# Altium footprint library Connectors THD.PcbLib: 631 footprints (part 18 of 46) (continued)
## HARTING_09 12 000 9908 [mm] "7 Positions, PC Board Adaptor For Han Q7/0® Module (PCB Thickness up to 2.4 mm)"
height 23
pads (7):
  round 1.6 hole 0.9: 1M7F(-6.3,4.8) 2M6F(-6.3,0) 3M5F(-6.3,-4.8) 4M4F(0,-4.8) 5M3F(6.3,-4.8) 6M2F(6.3,0) 7M1F(6.3,4.8)
Top Overlay:
  circle w0.2: c-6.3,0 r2.1
  circle w0.2: c0,-4.8 r2.1
  circle w0.2: c0,-4.8 r1.6
  circle w0.2: c-6.3,-4.8 r1.6
  circle w0.2: c-6.3,0 r1.6
  circle w0.2: c-6.3,4.8 r1.6
  circle w0.2: c6.3,4.8 r1.6
  circle w0.2: c6.3,0 r1.6
  circle w0.2: c6.3,-4.8 r1.6
  circle w0.2: c6.3,0 r2.1
  circle w0.2: c6.3,4.8 r2.1
  circle w0.2: c6.3,-4.8 r2.1
  circle w0.2: c-6.3,-4.8 r2.1
  circle w0.2: c-6.3,4.8 r2.1
  lines w0.2: -8.4,-4.8 -8.4,4.8 ; -6.3,-6.9 6.3,-6.9 ; -4.2,4.8 ccw(c-1.7,4.8) -1.699,2.3 1.7,2.301 ; 1.7,2.301 ccw(c1.7,4.801) 4.2,4.8 ; 8.4,-4.8 8.4,4.799
  text "1M" at -3.6,4.4 h1.2
  text "1F" at 1.8,4.3 h1.2
Mechanical 8:
  lines w0.1: -6.8,-4.8 -6.3,-4.8 ; -6.8,0 -6.3,0 ; -6.8,4.8 -6.3,4.8 ; -6.3,-5.3 -6.3,-4.8 ; -6.3,-4.3 -6.3,-4.8 ; -6.3,-0.5 -6.3,0 ; -6.3,0.5 -6.3,0 ; -6.3,4.3 -6.3,4.8 ; -6.3,5.3 -6.3,4.8 ; -5.8,-4.8 -6.3,-4.8 ; -5.8,0 -6.3,0 ; -5.8,4.8 -6.3,4.8 ; -0.5,-4.8 0,-4.8 ; -0.5,0 0,0 ; 0,-5.3 0,-4.8 ; 0,-4.3 0,-4.8 ; 0,-0.5 0,0 ; 0,0.5 0,0 ; 0.5,-4.8 0,-4.8 ; 0.5,0 0,0 ; 5.8,-4.8 6.3,-4.8 ; 5.8,0 6.3,0 ; 5.8,4.8 6.3,4.8 ; 6.3,-5.3 6.3,-4.8 ; 6.3,-4.3 6.3,-4.8 ; 6.3,-0.5 6.3,0 ; 6.3,0.5 6.3,0 ; 6.3,4.3 6.3,4.8 ; 6.3,5.3 6.3,4.8 ; 6.8,-4.8 6.3,-4.8 ; 6.8,0 6.3,0 ; 6.8,4.8 6.3,4.8
Mechanical 14:
  circle w0.1: c-6.3,0 r2.1
  circle w0.1: c0,-4.8 r2.1
  circle w0.1: c0,-4.8 r1.6
  circle w0.1: c0,-4.8 r0.6
  circle w0.1: c-6.3,-4.8 r1.6
  circle w0.1: c-6.3,-4.8 r0.6
  circle w0.1: c-6.3,0 r1.6
  circle w0.1: c-6.3,0 r0.6
  circle w0.1: c-6.3,4.8 r1.6
  circle w0.1: c-6.3,4.8 r0.6
  circle w0.1: c6.3,4.8 r1.6
  circle w0.1: c6.3,4.8 r0.6
  circle w0.1: c6.3,0 r1.6
  circle w0.1: c6.3,0 r0.6
  circle w0.1: c6.3,-4.8 r1.6
  circle w0.1: c6.3,-4.8 r0.6
  circle w0.1: c6.3,0 r2.1
  circle w0.1: c6.3,4.8 r2.1
  circle w0.1: c6.3,-4.8 r2.1
  circle w0.1: c-6.3,-4.8 r2.1
  circle w0.1: c-6.3,4.8 r2.1
  lines w0.1: -8.4,-4.8 -8.4,4.8 ; -6.3,-6.9 6.3,-6.9 ; -4.2,4.8 ccw(c-1.7,4.8) -1.699,2.3 1.7,2.301 ; 1.7,2.301 ccw(c1.7,4.801) 4.2,4.8 ; 8.4,-4.8 8.4,4.799
  text "1M" at -3.6,4.4 h1.2
  text "1F" at 1.8,4.3 h1.2
3D body: height 15.9, standoff -3.4, extent -8.4,-6.9 8.4,6.9

## HARTING_09 12 012 9901 [mm] "12 Positions + PE, PC Board Adaptor For Han Q12/0® Module (PCB Thickness up to 2.4 mm)"
height 14.65
pads (13):
  round 1.6 hole 0.9: 1M4F(-6.75,-6.75) 2M3F(-2.25,-6.75) 3M2F(2.25,-6.75) 4M1F(6.75,-6.75) 5M8F(-6.75,-2.25) 6M7F(-2.25,-2.25) 7M6F(2.25,-2.25) 8M5F(6.75,-2.25) 9M10F(-6.75,2.25) 10M9F(6.75,2.25) 11M12F(-6.75,6.75) 12M11F(6.75,6.75) PE(0,5.85)
Top Overlay:
  circle w0.2: c0,5.85 r2.1
  circle w0.2: c0,5.85 r1.6
  circle w0.2: c6.75,2.25 r1.85
  circle w0.2: c6.75,2.25 r1.6
  circle w0.2: c6.75,6.75 r1.85
  circle w0.2: c6.75,6.75 r1.6
  circle w0.2: c-6.75,6.75 r1.85
  circle w0.2: c-6.75,6.75 r1.6
  circle w0.2: c-6.75,2.25 r1.85
  circle w0.2: c-6.75,2.25 r1.6
  circle w0.2: c6.75,-2.25 r1.85
  circle w0.2: c6.75,-2.25 r1.6
  circle w0.2: c2.25,-2.25 r1.85
  circle w0.2: c2.25,-2.25 r1.6
  circle w0.2: c-2.25,-2.25 r1.85
  circle w0.2: c-2.25,-2.25 r1.6
  circle w0.2: c-6.75,-2.25 r1.85
  circle w0.2: c-6.75,-2.25 r1.6
  circle w0.2: c-6.75,-6.75 r1.85
  circle w0.2: c-6.75,-6.75 r1.6
  circle w0.2: c-2.25,-6.75 r1.85
  circle w0.2: c-2.25,-6.75 r1.6
  circle w0.2: c2.25,-6.75 r1.85
  circle w0.2: c2.25,-6.75 r1.6
  circle w0.2: c6.75,-6.75 r1.85
  circle w0.2: c6.75,-6.75 r1.6
  lines w0.2: -3.9,3.55 3.9,3.55 ; -3.9,8.55 3.9,8.55 ; -9.1,-7.1 ccw(c-7.1,-7.1) -7.1,-9.1 7.1,-9.1 ccw(c7.1,-7.1) 9.1,-7.1 9.1,7.1 ccw(c7.1,7.1) 7.1,9.1 4.4,9.1 ccw(c4.4,8.6) 3.9,8.6 3.9,0.15 cw(c3.4,0.15) 3.4,-0.35 -3.4,-0.35 cw(c-3.4,0.15) -3.9,0.15 -3.9,8.6 ccw(c-4.4,8.6) -4.4,9.1 -7.1,9.1 ccw(c-7.1,7.1) -9.1,7.1 -9.1,-7.1
  text "1F" at 5.9,-10.8 h1.2
  text "1M" at -7.6,-10.8 h1.2
Mechanical 8:
  lines w0.1: -7.25,-6.75 -6.75,-6.75 ; -7.25,-2.25 -6.75,-2.25 ; -7.25,2.25 -6.75,2.25 ; -7.25,6.75 -6.75,6.75 ; -6.75,-7.25 -6.75,-6.75 ; -6.75,-6.25 -6.75,-6.75 ; -6.75,-2.75 -6.75,-2.25 ; -6.75,-1.75 -6.75,-2.25 ; -6.75,1.75 -6.75,2.25 ; -6.75,2.75 -6.75,2.25 ; -6.75,6.25 -6.75,6.75 ; -6.75,7.25 -6.75,6.75 ; -6.25,-6.75 -6.75,-6.75 ; -6.25,-2.25 -6.75,-2.25 ; -6.25,2.25 -6.75,2.25 ; -6.25,6.75 -6.75,6.75 ; -2.75,-6.75 -2.25,-6.75 ; -2.75,-2.25 -2.25,-2.25 ; -2.25,-7.25 -2.25,-6.75 ; -2.25,-6.25 -2.25,-6.75 ; -2.25,-2.75 -2.25,-2.25 ; -2.25,-1.75 -2.25,-2.25 ; -1.75,-6.75 -2.25,-6.75 ; -1.75,-2.25 -2.25,-2.25 ; -0.5,0 0,0 ; -0.5,5.85 0,5.85 ; 0,-0.5 0,0 ; 0,0.5 0,0 ; 0,5.35 0,5.85 ; 0,6.35 0,5.85 ; 0.5,0 0,0 ; 0.5,5.85 0,5.85 ; 1.75,-6.75 2.25,-6.75 ; 1.75,-2.25 2.25,-2.25 ; 2.25,-7.25 2.25,-6.75 ; 2.25,-6.25 2.25,-6.75 ; 2.25,-2.75 2.25,-2.25 ; 2.25,-1.75 2.25,-2.25 ; 2.75,-6.75 2.25,-6.75 ; 2.75,-2.25 2.25,-2.25 ; 6.25,-6.75 6.75,-6.75 ; 6.25,-2.25 6.75,-2.25 ; 6.25,2.25 6.75,2.25 ; 6.25,6.75 6.75,6.75 ; 6.75,-7.25 6.75,-6.75 ; 6.75,-6.25 6.75,-6.75 ; 6.75,-2.75 6.75,-2.25 ; 6.75,-1.75 6.75,-2.25 ; 6.75,1.75 6.75,2.25 ; 6.75,2.75 6.75,2.25 ; 6.75,6.25 6.75,6.75 ; 6.75,7.25 6.75,6.75 ; 7.25,-6.75 6.75,-6.75 ; 7.25,-2.25 6.75,-2.25 ; 7.25,2.25 6.75,2.25 ; 7.25,6.75 6.75,6.75
Mechanical 14:
  circle w0.1: c0,5.85 r2.1
  circle w0.1: c0,5.85 r1.6
  circle w0.1: c0,5.85 r0.6
  circle w0.1: c6.75,2.25 r1.85
  circle w0.1: c6.75,2.25 r1.6
  circle w0.1: c6.75,2.25 r0.6
  circle w0.1: c6.75,6.75 r1.85
  circle w0.1: c6.75,6.75 r1.6
  circle w0.1: c6.75,6.75 r0.6
  circle w0.1: c-6.75,6.75 r1.85
  circle w0.1: c-6.75,6.75 r1.6
  circle w0.1: c-6.75,6.75 r0.6
  circle w0.1: c-6.75,2.25 r1.85
  circle w0.1: c-6.75,2.25 r1.6
  circle w0.1: c-6.75,2.25 r0.6
  circle w0.1: c6.75,-2.25 r1.85
  circle w0.1: c6.75,-2.25 r1.6
  circle w0.1: c6.75,-2.25 r0.6
  circle w0.1: c2.25,-2.25 r1.85
  circle w0.1: c2.25,-2.25 r1.6
  circle w0.1: c2.25,-2.25 r0.6
  circle w0.1: c-2.25,-2.25 r1.85
  circle w0.1: c-2.25,-2.25 r1.6
  circle w0.1: c-2.25,-2.25 r0.6
  circle w0.1: c-6.75,-2.25 r1.85
  circle w0.1: c-6.75,-2.25 r1.6
  circle w0.1: c-6.75,-2.25 r0.6
  circle w0.1: c-6.75,-6.75 r1.85
  circle w0.1: c-6.75,-6.75 r1.6
  circle w0.1: c-6.75,-6.75 r0.6
  circle w0.1: c-2.25,-6.75 r1.85
  circle w0.1: c-2.25,-6.75 r1.6
  circle w0.1: c-2.25,-6.75 r0.6
  circle w0.1: c2.25,-6.75 r1.85
  circle w0.1: c2.25,-6.75 r1.6
  circle w0.1: c2.25,-6.75 r0.6
  circle w0.1: c6.75,-6.75 r1.85
  circle w0.1: c6.75,-6.75 r1.6
  circle w0.1: c6.75,-6.75 r0.6
  lines w0.1: -3.9,3.55 3.9,3.55 ; -3.9,8.55 3.9,8.55 ; -9.1,-7.1 ccw(c-7.1,-7.1) -7.1,-9.1 7.1,-9.1 ccw(c7.1,-7.1) 9.1,-7.1 9.1,7.1 ccw(c7.1,7.1) 7.1,9.1 4.4,9.1 ccw(c4.4,8.6) 3.9,8.6 3.9,0.15 cw(c3.4,0.15) 3.4,-0.35 -3.4,-0.35 cw(c-3.4,0.15) -3.9,0.15 -3.9,8.6 ccw(c-4.4,8.6) -4.4,9.1 -7.1,9.1 ccw(c-7.1,7.1) -9.1,7.1 -9.1,-7.1
  text "1F" at 5.9,-10.8 h1.2
  text "1M" at -7.6,-10.8 h1.2
3D body: height 14.65, standoff -3.65, extent -9.1,-9.1 9.1,9.1

## HARTING_09 16 000 9908 [mm] "6 Positions, PC Board Adaptor For Han DD® Module (PCB Thickness up to 2.4 mm)"
height 15.9
pads (6):
  round 1.6 hole 0.9: 1(-11.25,0) 2(-6.75,0) 3(-2.25,0) 4(2.25,0) 5(6.75,0) 6(11.25,0)
Top Overlay:
  circle w0.2: c11.25,0 r1.861
  circle w0.2: c11.25,0 r1.65
  circle w0.2: c6.75,0 r1.861
  circle w0.2: c6.75,0 r1.65
  circle w0.2: c2.25,0 r1.861
  circle w0.2: c2.25,0 r1.65
  circle w0.2: c-2.25,0 r1.861
  circle w0.2: c-2.25,0 r1.65
  circle w0.2: c-6.75,0 r1.861
  circle w0.2: c-11.25,0 r1.861
  circle w0.2: c-11.25,0 r1.65
  circle w0.2: c-6.75,0 r1.65
  lines w0.2: -10.379,-1.75 -10.09,-2.25 ; -10.08,2.25 -10.426,2.85 cw(c-10.253,2.95) -10.253,3.15 -7.747,3.15 cw(c-7.747,2.95) -7.574,2.85 -7.92,2.25 ; -9.5,-1.25 -8.5,-1.25 ; -7.91,-2.25 -7.621,-1.75 ; 3.121,-1.75 3.41,-2.25 ; 3.42,2.25 3.074,2.85 cw(c3.247,2.95) 3.247,3.15 5.753,3.15 cw(c5.753,2.95) 5.926,2.85 5.58,2.25 ; 4,-1.25 5,-1.25 ; 5.59,-2.25 5.879,-1.75 ; -14,-1.25 ccw(c-13,-1.25) -13,-2.25 13,-2.25 ccw(c13,-1.25) 14,-1.25 14,1.25 ccw(c13,1.25) 13,2.25 -13,2.25 ccw(c-13,1.25) -14,1.25 -14,-1.25
  text "1" at -14.9,-0.5 h1.2
  text "6" at 14.585,-0.527 h1.2
Mechanical 8:
  lines w0.1: -11.75,0 -11.25,0 ; -11.25,-0.5 -11.25,0 ; -11.25,0.5 -11.25,0 ; -10.75,0 -11.25,0 ; -7.25,0 -6.75,0 ; -6.75,-0.5 -6.75,0 ; -6.75,0.5 -6.75,0 ; -6.25,0 -6.75,0 ; -2.75,0 -2.25,0 ; -2.25,-0.5 -2.25,0 ; -2.25,0.5 -2.25,0 ; -1.75,0 -2.25,0 ; -0.5,0 0,0 ; 0,-0.5 0,0 ; 0,0.5 0,0 ; 0.5,0 0,0 ; 1.75,0 2.25,0 ; 2.25,-0.5 2.25,0 ; 2.25,0.5 2.25,0 ; 2.75,0 2.25,0 ; 6.25,0 6.75,0 ; 6.75,-0.5 6.75,0 ; 6.75,0.5 6.75,0 ; 7.25,0 6.75,0 ; 10.75,0 11.25,0 ; 11.25,-0.5 11.25,0 ; 11.25,0.5 11.25,0 ; 11.75,0 11.25,0
Mechanical 14:
  circle w0.1: c11.25,0 r1.861
  circle w0.1: c11.25,0 r1.65
  circle w0.1: c11.25,0 r0.6
  circle w0.1: c6.75,0 r1.861
  circle w0.1: c6.75,0 r1.65
  circle w0.1: c6.75,0 r0.6
  circle w0.1: c2.25,0 r1.861
  circle w0.1: c2.25,0 r1.65
  circle w0.1: c2.25,0 r0.6
  circle w0.1: c-2.25,0 r1.861
  circle w0.1: c-2.25,0 r1.65
  circle w0.1: c-2.25,0 r0.6
  circle w0.1: c-6.75,0 r1.861
  circle w0.1: c-6.75,0 r1.65
  circle w0.1: c-6.75,0 r0.6
  circle w0.1: c-11.25,0 r1.861
  circle w0.1: c-11.25,0 r1.65
  circle w0.1: c-11.25,0 r0.6
  lines w0.1: -10.494,-1.55 cw(c-10.321,-1.45) -10.321,-1.25 -10,-1.25 ; -10.379,-1.75 -10.09,-2.25 ; -10.08,2.25 -10.426,2.85 cw(c-10.253,2.95) -10.253,3.15 -7.747,3.15 cw(c-7.747,2.95) -7.574,2.85 -7.92,2.25 ; -9.5,-1.25 -8.5,-1.25 ; -8,-1.25 -7.679,-1.25 cw(c-7.679,-1.45) -7.506,-1.55 ; -7.91,-2.25 -7.621,-1.75 ; 3.006,-1.55 cw(c3.179,-1.45) 3.179,-1.25 3.5,-1.25 ; 3.121,-1.75 3.41,-2.25 ; 3.42,2.25 3.074,2.85 cw(c3.247,2.95) 3.247,3.15 5.753,3.15 cw(c5.753,2.95) 5.926,2.85 5.58,2.25 ; 4,-1.25 5,-1.25 ; 5.5,-1.25 5.821,-1.25 cw(c5.821,-1.45) 5.994,-1.55 ; 5.59,-2.25 5.879,-1.75 ; -14,-1.25 ccw(c-13,-1.25) -13,-2.25 13,-2.25 ccw(c13,-1.25) 14,-1.25 14,1.25 ccw(c13,1.25) 13,2.25 -13,2.25 ccw(c-13,1.25) -14,1.25 -14,-1.25
  text "6" at 14.585,-0.527 h1.2
  text "1" at -14.9,-0.5 h1.2
3D body: height 15.9, standoff -3.3, extent -14,-2.25 14,3.15

## HARTING_09 22 132 6921 [mm] "Connector; DIN 41612, Type 2B, Thru-Hole; Rows a+b, 32 Position; Right Angle"
height 8.5
pads (34):
  round 1.7 hole 1: a1(0,0) a2(0,-2.54) a3(0,-5.08) a4(0,-7.62) a5(0,-10.16) a6(0,-12.7) a7(0,-15.24) a8(0,-17.78) a9(0,-20.32) a10(0,-22.86) a11(0,-25.4) a12(0,-27.94) a13(0,-30.48) a14(0,-33.02) a15(0,-35.56) a16(0,-38.1) b1(-2.54,0) b2(-2.54,-2.54) b3(-2.54,-5.08) b4(-2.54,-7.62) b5(-2.54,-10.16) b6(-2.54,-12.7) b7(-2.54,-15.24) b8(-2.54,-17.78) b9(-2.54,-20.32) b10(-2.54,-22.86) b11(-2.54,-25.4) b12(-2.54,-27.94) b13(-2.54,-30.48) b14(-2.54,-33.02) b15(-2.54,-35.56) b16(-2.54,-38.1)
  round 3.5 / inner round 3.5 / far side round 5.1 hole 2.8: MTG1(2.54,5.08) MTG2(2.54,-43.18)
Top Overlay:
  lines w0.2: 2.04,-40.18 -0.36,-40.18 -0.36,-46.05 7.69,-46.05 7.69,-42.5 ; 2.04,2.08 -0.36,2.08 -0.36,7.95 7.69,7.95 7.69,4.4 ; 4.32,-41.15 3.847,-40.33 2.04,-40.33 2.04,2.23 3.847,2.23 4.32,3.05 ; 5.3,-42.5 12.64,-42.5 12.64,4.4 5.3,4.4
  text "15" at -5.855,-36.235 h1.2
  text "1" at -4.58,-0.7 h1.2
  text "b" at -2.56,1.87 h1.2
  text "a" at -1.12,1.87 h1.2
  text "5" at -4.93,-10.735 h1.2
  text "10" at -5.855,-23.535 h1.2
Mechanical 8:
  drawing of 209 lines, arcs and shapes, not listed
  text "PCB" at 5.055,-19.45 h1.2
Mechanical 14:
  circle w0.1: c2.54,-43.18 r1.25
  circle w0.1: c2.54,5.08 r1.25
  lines w0.1: 2.04,-40.18 -0.36,-40.18 -0.36,-46.05 7.69,-46.05 7.69,-42.5 ; 2.04,2.08 -0.36,2.08 -0.36,7.95 7.69,7.95 7.69,4.4 ; 2.04,-40.33 2.04,2.23 3.847,2.23 5.1,4.4 12.64,4.4 12.64,-42.5 5.1,-42.5 3.847,-40.33 2.04,-40.33
  text "15" at -5.855,-36.235 h1.2
  text "10" at -5.855,-23.535 h1.2
  text "1" at -4.58,-0.7 h1.2
  text "5" at -4.93,-10.735 h1.2
3D body: height 6.83, standoff -3, extent -2.79,-46.05 12.64,7.95

## HARTING_09 22 232 6850 [mm] "DIN 41612, Type 2B, Thru-Hole Press-in Terminations;  Rows a+b, 32 Positions, Performance level 2, Lead 4.5 mm, Pitch 2.54mm, Straight Female Connector"
height 11.6
pads (34):
  round 1.7 hole 1: a1(0,0) a2(0,-2.54) a3(0,-5.08) a4(0,-7.62) a5(0,-10.16) a6(0,-12.7) a7(0,-15.24) a8(0,-17.78) a9(0,-20.32) a10(0,-22.86) a11(0,-25.4) a12(0,-27.94) a13(0,-30.48) a14(0,-33.02) a15(0,-35.56) a16(0,-38.1) b1(2.54,0) b2(2.54,-2.54) b3(2.54,-5.08) b4(2.54,-7.62) b5(2.54,-10.16) b6(2.54,-12.7) b7(2.54,-15.24) b8(2.54,-17.78) b9(2.54,-20.32) b10(2.54,-22.86) b11(2.54,-25.4) b12(2.54,-27.94) b13(2.54,-30.48) b14(2.54,-33.02) b15(2.54,-35.56) b16(2.54,-38.1)
  round 3.5 / inner round 3.5 / far side round 5.1 hole 2.8: MTG1(2.24,5.95) MTG2(2.24,-44.05)
Top Overlay:
  lines w0.2: -2.73,-44.05 -0.71,-44.05 ; -2.73,5.95 -0.71,5.95 ; -1.08,-37.705 -1.08,-40.6 ; -1.08,0.395 -1.08,2.5 ; -0.71,-46.5 -0.71,-44.05 ; -0.71,8.4 -0.71,5.95 ; -0.214,-43.191 -0.71,-44.05 ; -0.214,5.091 -0.71,5.95 ; 0.269,-42.354 0.907,-41.25 3.653,-41.25 4.375,-42.5 5.27,-42.5 ; 0.269,4.254 0.907,3.15 3.025,3.15 ; 1.37,-46.5 -2.73,-46.5 -2.73,8.4 1.37,8.4 ; 3.11,-46.5 5.27,-46.5 5.27,8.4 3.11,8.4 ; 3.62,-38.495 3.62,-39.55 ; 3.62,0.395 3.62,1.45 ; 4.014,3.775 4.375,4.4 5.27,4.4 ; -1.73,-41.25 -1.08,-40.6 ; -1.73,-41.25 -1.73,3.15 ; -1.73,-41.25 1.17,-41.25 ; -1.73,3.15 -1.08,2.5 ; -1.73,3.15 1.17,3.15 ; -1.08,-40.6 0.52,-40.6 ; -1.08,2.5 0.52,2.5 ; 0.52,-40.6 1.17,-41.25 ; 0.52,-40.6 0.52,-39.55 ; 0.52,-39.55 1.17,-40.2 ; 0.52,-39.55 3.62,-39.55 ; 0.52,1.45 1.17,2.1 ; 0.52,1.45 3.62,1.45 ; 0.52,1.45 0.52,2.5 ; 0.52,2.5 1.17,3.15 ; 1.17,-41.25 1.17,-40.2 ; 1.17,-40.2 4.27,-40.2 ; 1.17,2.1 4.27,2.1 ; 1.17,2.1 1.17,3.15 ; 3.62,-39.55 4.27,-40.2 ; 3.62,1.45 4.27,2.1 ; 4.27,-40.2 4.27,2.1
  text "a" at -0.575,3.725 h1.2
  text "b" at 4.65,2.55 h1.2
  text "10" at -5.34,-23.51 h1.2
  text "5" at -4.415,-10.71 h1.2
  text "1" at -4.065,-0.675 h1.2
  text "15" at -5.34,-36.21 h1.2
Mechanical 8:
  lines w0.1: 0,-38.1 -0.5,-38.1 0,-38.1 ; 0,-38.1 0,-38.6 0,-38.1 ; 0,-38.1 0.5,-38.1 0,-38.1 ; 0,-38.1 0,-37.6 0,-38.1 ; 0,0 -0.5,0 0,0 ; 0,0 0,-0.5 0,0 ; 0,0 0.5,0 0,0 ; 0,0 0,0.5 0,0 ; 2.24,-44.05 1.74,-44.05 2.24,-44.05 ; 2.24,-44.05 2.24,-44.55 2.24,-44.05 ; 2.24,-44.05 2.74,-44.05 2.24,-44.05 ; 2.24,-44.05 2.24,-43.55 2.24,-44.05 ; 2.24,5.95 1.74,5.95 2.24,5.95 ; 2.24,5.95 2.24,5.45 2.24,5.95 ; 2.24,5.95 2.74,5.95 2.24,5.95 ; 2.24,5.95 2.24,6.45 2.24,5.95 ; 2.54,-38.1 2.04,-38.1 2.54,-38.1 ; 2.54,-38.1 2.54,-38.6 2.54,-38.1 ; 2.54,-38.1 3.04,-38.1 2.54,-38.1 ; 2.54,-38.1 2.54,-37.6 2.54,-38.1 ; 2.54,0 2.04,0 2.54,0 ; 2.54,0 2.54,-0.5 2.54,0 ; 2.54,0 3.04,0 2.54,0 ; 2.54,0 2.54,0.5 2.54,0
Mechanical 14:
  drawing of 426 lines, arcs and shapes, not listed
  text "b" at 4.65,2.55 h1.2
  text "a" at -0.575,3.725 h1.2
  text "5" at -4.415,-10.71 h1.2
  text "1" at -4.065,-0.675 h1.2
  text "10" at -5.34,-23.51 h1.2
  text "15" at -5.34,-36.21 h1.2
Drill Drawing:
  lines w0.1: -2.73,-39.5 5.27,-39.5 5.27,1.5 -2.73,1.5 -2.73,-39.5
  text "PRESS-FIT TECHNOLOGY diam. 1mm +0.1 -0" at -1.325,-37.125 h1
3D body: height 11.6, standoff -4.5, extent -2.73,-46.5 5.27,8.4

## HARTING_09 23 148 6921 [mm] "DIN 41612, Type 2C, Thru-Hole;  Rows a+b+c, 48 Position, Performance level 2, Lead 3.0 mm, Pitch 2.54mm, Right Angle Male Connector"
height 11
pads (50):
  round 1.7 hole 1: a1(0,0) a2(0,-2.54) a3(0,-5.08) a4(0,-7.62) a5(0,-10.16) a6(0,-12.7) a7(0,-15.24) a8(0,-17.78) a9(0,-20.32) a10(0,-22.86) a11(0,-25.4) a12(0,-27.94) a13(0,-30.48) a14(0,-33.02) a15(0,-35.56) a16(0,-38.1) b1(-2.54,0) b2(-2.54,-2.54) b3(-2.54,-5.08) b4(-2.54,-7.62) b5(-2.54,-10.16) b6(-2.54,-12.7) b7(-2.54,-15.24) b8(-2.54,-17.78) b9(-2.54,-20.32) b10(-2.54,-22.86) b11(-2.54,-25.4) b12(-2.54,-27.94) b13(-2.54,-30.48) b14(-2.54,-33.02) b15(-2.54,-35.56) b16(-2.54,-38.1) c1(-5.08,0) c2(-5.08,-2.54) c3(-5.08,-5.08) c4(-5.08,-7.62) c5(-5.08,-10.16) c6(-5.08,-12.7) c7(-5.08,-15.24) c8(-5.08,-17.78) c9(-5.08,-20.32) c10(-5.08,-22.86) c11(-5.08,-25.4) c12(-5.08,-27.94) c13(-5.08,-30.48) c14(-5.08,-33.02) c15(-5.08,-35.56) c16(-5.08,-38.1)
  round 3.5 / inner round 3.5 / far side round 5.1 hole 2.8: MTG1(2.54,5.08) MTG2(2.54,-43.18)
Top Overlay:
  lines w0.2: 2.04,-40.33 2.04,2.23 ; 7.69,-42.5 7.69,-46.05 -0.36,-46.05 -0.36,-40.33 3.897,-40.33 5.15,-42.5 12.64,-42.5 12.64,4.4 5.15,4.4 3.897,2.23 -0.36,2.23 -0.36,7.95 7.69,7.95 7.69,4.4
Mechanical 8:
  lines w0.1: -5.58,-38.1 -5.08,-38.1 ; -5.58,0 -5.08,0 ; -5.08,-38.6 -5.08,-38.1 ; -5.08,-37.6 -5.08,-38.1 ; -5.08,-0.5 -5.08,0 ; -5.08,0.5 -5.08,0 ; -4.58,-38.1 -5.08,-38.1 ; -4.58,0 -5.08,0 ; -3.04,-38.1 -2.54,-38.1 ; -3.04,0 -2.54,0 ; -2.54,-38.6 -2.54,-38.1 ; -2.54,-37.6 -2.54,-38.1 ; -2.54,-0.5 -2.54,0 ; -2.54,0.5 -2.54,0 ; -2.04,-38.1 -2.54,-38.1 ; -2.04,0 -2.54,0 ; -0.5,-38.1 0,-38.1 ; -0.5,0 0,0 ; 0,-38.6 0,-38.1 ; 0,-37.6 0,-38.1 ; 0,-0.5 0,0 ; 0,0.5 0,0 ; 0.5,-38.1 0,-38.1 ; 0.5,0 0,0 ; 2.04,-43.18 2.54,-43.18 ; 2.04,5.08 2.54,5.08 ; 2.54,-43.68 2.54,-43.18 ; 2.54,-42.68 2.54,-43.18 ; 2.54,4.58 2.54,5.08 ; 2.54,5.58 2.54,5.08 ; 3.04,-43.18 2.54,-43.18 ; 3.04,5.08 2.54,5.08 ; 5.3,-46.05 5.3,-19.05 5.3,7.95
Mechanical 14:
  circle w0.1: c2.54,-43.18 r1.25
  circle w0.1: c2.54,5.08 r1.25
  lines w0.1: 2.04,-40.33 2.04,2.23 ; 7.69,-42.5 7.69,-46.05 -0.36,-46.05 -0.36,-40.33 3.897,-40.33 5.15,-42.5 12.64,-42.5 12.64,4.4 5.15,4.4 3.897,2.23 -0.36,2.23 -0.36,7.95 7.69,7.95 7.69,4.4
3D body: height 9.35, standoff -3, extent -5.33,-46.05 12.64,7.95

## HARTING_09 23 248 6824 [mm] "DIN 41612, Type 2C, Thru-Hole;  Rows a+b+c, 48 Position, Performance level 2, Lead 2.9 mm, Pitch 2.54mm, Vertical Female Connector"
height 11.6
pads (50):
  round 1.7 hole 1: a1(0,0) a2(0,-2.54) a3(0,-5.08) a4(0,-7.62) a5(0,-10.16) a6(0,-12.7) a7(0,-15.24) a8(0,-17.78) a9(0,-20.32) a10(0,-22.86) a11(0,-25.4) a12(0,-27.94) a13(0,-30.48) a14(0,-33.02) a15(0,-35.56) a16(0,-38.1) b1(2.54,0) b2(2.54,-2.54) b3(2.54,-5.08) b4(2.54,-7.62) b5(2.54,-10.16) b6(2.54,-12.7) b7(2.54,-15.24) b8(2.54,-17.78) b9(2.54,-20.32) b10(2.54,-22.86) b11(2.54,-25.4) b12(2.54,-27.94) b13(2.54,-30.48) b14(2.54,-33.02) b15(2.54,-35.56) b16(2.54,-38.1) c1(5.08,0) c2(5.08,-2.54) c3(5.08,-5.08) c4(5.08,-7.62) c5(5.08,-10.16) c6(5.08,-12.7) c7(5.08,-15.24) c8(5.08,-17.78) c9(5.08,-20.32) c10(5.08,-22.86) c11(5.08,-25.4) c12(5.08,-27.94) c13(5.08,-30.48) c14(5.08,-33.02) c15(5.08,-35.56) c16(5.08,-38.1)
  round 3.5 / inner round 3.5 / far side round 5.1 hole 2.8: MTG1(2.24,5.95) MTG2(2.24,-44.05)
Top Overlay:
  lines w0.2: -2.71,-44.05 -0.735,-44.05 ; -2.71,-37.55 -1.71,-37.55 ; -2.71,-0.55 -1.71,-0.55 ; -2.71,5.95 -0.735,5.95 ; -1.06,-38.763 -1.06,-40.6 ; -1.06,0.662 -1.06,2.5 ; -0.735,-46.5 -0.735,-44.05 ; -0.735,8.4 -0.735,5.95 ; -0.395,-43.461 -0.735,-44.05 ; -0.395,5.361 -0.735,5.95 ; 0.412,-42.063 0.882,-41.25 ; 0.412,3.962 0.882,3.15 ; 1.105,-46.5 -2.71,-46.5 -2.71,8.4 1.105,8.4 ; 3.375,-46.5 7.79,-46.5 7.79,8.4 3.375,8.4 ; 3.598,-41.25 4.068,-42.063 ; 3.598,3.15 4.068,3.962 ; 4.875,-43.461 5.215,-44.05 ; 4.875,5.361 5.215,5.95 ; 5.215,-46.5 5.215,-44.05 ; 5.215,8.4 5.215,5.95 ; 6.14,-38.763 6.14,-39.55 ; 6.14,0.662 6.14,1.45 ; 6.79,-37.55 7.79,-37.55 ; 6.79,-0.55 7.79,-0.55 ; 7.79,-44.05 5.215,-44.05 ; 7.79,5.95 5.215,5.95 ; -1.71,-41.25 -1.06,-40.6 ; -1.71,-41.25 3.69,-41.25 ; -1.71,-41.25 -1.71,3.15 ; -1.71,3.15 -1.06,2.5 ; -1.71,3.15 3.69,3.15 ; -1.06,-40.6 3.04,-40.6 ; -1.06,2.5 3.04,2.5 ; 3.04,-40.6 3.04,-39.55 ; 3.04,-40.6 3.69,-41.25 ; 3.04,-39.55 6.14,-39.55 ; 3.04,-39.55 3.69,-40.2 ; 3.04,1.45 3.04,2.5 ; 3.04,1.45 3.69,2.1 ; 3.04,1.45 6.14,1.45 ; 3.04,2.5 3.69,3.15 ; 3.69,-41.25 3.69,-40.2 ; 3.69,-40.2 6.79,-40.2 ; 3.69,2.1 6.79,2.1 ; 3.69,2.1 3.69,3.15 ; 6.14,-39.55 6.79,-40.2 ; 6.14,1.45 6.79,2.1 ; 6.79,-40.2 6.79,2.1
Mechanical 8:
  lines w0.1: -0.5,-38.1 0,-38.1 ; -0.5,0 0,0 ; 0,-38.6 0,-38.1 ; 0,-37.6 0,-38.1 ; 0,-0.5 0,0 ; 0,0.5 0,0 ; 0.5,-38.1 0,-38.1 ; 0.5,0 0,0 ; 1.74,-44.05 2.24,-44.05 ; 1.74,5.95 2.24,5.95 ; 2.04,-38.1 2.54,-38.1 ; 2.04,0 2.54,0 ; 2.24,-44.55 2.24,-44.05 ; 2.24,-43.55 2.24,-44.05 ; 2.24,5.45 2.24,5.95 ; 2.24,6.45 2.24,5.95 ; 2.54,-38.6 2.54,-38.1 ; 2.54,-37.6 2.54,-38.1 ; 2.54,-0.5 2.54,0 ; 2.54,0.5 2.54,0 ; 2.74,-44.05 2.24,-44.05 ; 2.74,5.95 2.24,5.95 ; 3.04,-38.1 2.54,-38.1 ; 3.04,0 2.54,0 ; 4.58,-38.1 5.08,-38.1 ; 4.58,0 5.08,0 ; 5.08,-38.6 5.08,-38.1 ; 5.08,-37.6 5.08,-38.1 ; 5.08,-0.5 5.08,0 ; 5.08,0.5 5.08,0 ; 5.58,-38.1 5.08,-38.1 ; 5.58,0 5.08,0
Mechanical 14:
  drawing of 670 lines, arcs and shapes, not listed
3D body: height 11.6, standoff -4.5, extent -2.71,-46.5 7.79,8.4

## HARTING_09 25 130 6921 [mm] "DIN 41612, Type 3C, Thru-Hole;  Rows a+b+c, 30 Positions, Performance level 2, Lead 3.0mm, Pitch 2.54mm, Right Angle Male Connector"
height 11
pads (32):
  round 1.7 hole 1: a1(0,0) a2(0,-2.54) a3(0,-5.08) a4(0,-7.62) a5(0,-10.16) a6(0,-12.7) a7(0,-15.24) a8(0,-17.78) a9(0,-20.32) a10(0,-22.86) b1(-2.54,0) b2(-2.54,-2.54) b3(-2.54,-5.08) b4(-2.54,-7.62) b5(-2.54,-10.16) b6(-2.54,-12.7) b7(-2.54,-15.24) b8(-2.54,-17.78) b9(-2.54,-20.32) b10(-2.54,-22.86) c1(-5.08,0) c2(-5.08,-2.54) c3(-5.08,-5.08) c4(-5.08,-7.62) c5(-5.08,-10.16) c6(-5.08,-12.7) c7(-5.08,-15.24) c8(-5.08,-17.78) c9(-5.08,-20.32) c10(-5.08,-22.86)
  round 3.5 / inner round 3.5 / far side round 5.1 hole 2.8: MTG1(2.54,5.08) MTG2(2.54,-27.94)
Top Overlay:
  lines w0.2: 2.04,-24.93 -0.31,-24.93 -0.31,-30.78 7.74,-30.78 7.74,-27.28 ; 2.04,2.07 -0.31,2.07 -0.31,7.92 7.74,7.92 7.74,4.32 ; 2.04,-25.14 2.04,2.18 3.897,2.18 5.132,4.32 12.64,4.32 12.64,-27.28 5.132,-27.28 3.897,-25.14 2.04,-25.14
  text "a" at 2.785,-0.395 h1.2
  text "c" at -5.465,1.48 h1.2
  text "b" at -2.94,1.48 h1.2
  text "1" at -6.919,-0.725 h1.2
  text "5" at -7.304,-10.76 h1.2
  text "10" at -8.327,-23.435 h1.2
Mechanical 8:
  lines w0.1: -5.58,-22.86 -5.08,-22.86 ; -5.08,-23.36 -5.08,-22.86 ; -5.08,-22.36 -5.08,-22.86 ; -4.58,-22.86 -5.08,-22.86 ; -3.04,-22.86 -2.54,-22.86 ; -2.54,-23.36 -2.54,-22.86 ; -2.54,-22.36 -2.54,-22.86 ; -2.04,-22.86 -2.54,-22.86 ; -0.5,-22.86 0,-22.86 ; -0.5,0 0,0 ; 0,-23.36 0,-22.86 ; 0,-22.36 0,-22.86 ; 0,-0.5 0,0 ; 0,0.5 0,0 ; 0.5,-22.86 0,-22.86 ; 0.5,0 0,0 ; 2.04,-27.94 2.54,-27.94 ; 2.04,5.08 2.54,5.08 ; 2.54,-28.44 2.54,-27.94 ; 2.54,-27.44 2.54,-27.94 ; 2.54,4.58 2.54,5.08 ; 2.54,5.58 2.54,5.08 ; 3.04,-27.94 2.54,-27.94 ; 3.04,5.08 2.54,5.08 ; -5.08,0 -5.58,0 -5.08,0 ; -5.08,0 -5.08,0.5 -5.08,0 ; -5.08,0 -4.58,0 -5.08,0 ; -5.08,0 -5.08,-0.5 -5.08,0 ; -2.54,0 -3.04,0 -2.54,0 ; -2.54,0 -2.54,0.5 -2.54,0 ; -2.54,0 -2.04,0 -2.54,0 ; -2.54,0 -2.54,-0.5 -2.54,0
Mechanical 14:
  lines w0.1: 2.04,-24.93 -0.31,-24.93 -0.31,-30.78 7.74,-30.78 7.74,-27.28 ; 2.04,-23.16 -5.08,-23.16 cw(c-5.08,-22.86) -5.08,-22.56 2.04,-22.562 ; 2.04,-20.62 -5.08,-20.62 cw(c-5.08,-20.32) -5.08,-20.02 2.04,-20.022 ; 2.04,-18.08 -5.08,-18.08 cw(c-5.08,-17.78) -5.08,-17.48 2.04,-17.482 ; 2.04,-15.54 -5.08,-15.54 cw(c-5.08,-15.24) -5.08,-14.94 2.04,-14.942 ; 2.04,-13 -5.08,-13 cw(c-5.08,-12.7) -5.08,-12.4 2.04,-12.402 ; 2.04,-10.46 -5.08,-10.46 cw(c-5.08,-10.16) -5.08,-9.86 2.04,-9.862 ; 2.04,-7.92 -5.08,-7.92 cw(c-5.08,-7.62) -5.08,-7.32 2.04,-7.322 ; 2.04,-5.38 -5.08,-5.38 cw(c-5.08,-5.08) -5.08,-4.78 2.04,-4.782 ; 2.04,-2.84 -5.08,-2.84 cw(c-5.08,-2.54) -5.08,-2.24 2.04,-2.242 ; 2.04,-0.3 -5.08,-0.3 cw(c-5.08,0) -5.08,0.3 2.04,0.298 ; 2.04,2.07 -0.31,2.07 -0.31,7.92 7.74,7.92 7.74,4.32 ; 2.04,-25.14 2.04,2.18 3.897,2.18 5.132,4.32 12.64,4.32 12.64,-27.28 5.132,-27.28 3.897,-25.14 2.04,-25.14
  text "c" at -5.465,1.48 h1.2
  text "b" at -2.94,1.48 h1.2
  text "5" at -7.304,-10.76 h1.2
  text "1" at -6.919,-0.725 h1.2
  text "10" at -8.327,-23.435 h1.2
3D body: height 9.35, standoff -3, extent -5.38,-30.78 12.64,7.92

## HARTING_09 25 230 6824 [mm] "DIN 41612, Type 3C, Thru-Hole;  Rows a+b+c, 30 Positions, Performance level 2, Lead 2.9 mm, Pitch 2.54mm, Vertical Female Connector"
height 11.6
pads (32):
  round 1.7 hole 1: a1(0,0) a2(0,-2.54) a3(0,-5.08) a4(0,-7.62) a5(0,-10.16) a6(0,-12.7) a7(0,-15.24) a8(0,-17.78) a9(0,-20.32) a10(0,-22.86) b1(2.54,0) b2(2.54,-2.54) b3(2.54,-5.08) b4(2.54,-7.62) b5(2.54,-10.16) b6(2.54,-12.7) b7(2.54,-15.24) b8(2.54,-17.78) b9(2.54,-20.32) b10(2.54,-22.86) c1(5.08,0) c2(5.08,-2.54) c3(5.08,-5.08) c4(5.08,-7.62) c5(5.08,-10.16) c6(5.08,-12.7) c7(5.08,-15.24) c8(5.08,-17.78) c9(5.08,-20.32) c10(5.08,-22.86)
  round 3.5 / inner round 3.5 / far side round 5.1 hole 2.8: MTG1(2.24,5.76) MTG2(2.24,-28.62)
Top Overlay:
  lines w0.2: -2.71,-28.62 -0.735,-28.62 ; -2.71,-22.12 -1.71,-22.12 ; -2.71,-0.74 -1.71,-0.74 ; -2.71,5.76 -0.81,5.76 ; -1.06,-23.523 -1.06,-25.355 ; -1.06,0.662 -1.06,2.495 ; -0.81,8.52 -0.81,5.76 ; -0.735,-31.38 -0.735,-28.62 ; -0.66,-25.355 -1.06,-25.355 ; -0.66,2.495 -1.06,2.495 ; 2.34,-26.005 2.34,-25.005 -0.66,-25.005 -0.66,-26.005 -1.71,-26.005 ; 2.34,-25.355 3.04,-25.355 ; 2.34,2.495 3.04,2.495 ; 2.34,3.145 2.34,2.145 -0.66,2.145 -0.66,3.145 -1.71,3.145 ; 3.705,-26.005 0.775,-26.005 -0.735,-28.62 ; 5.19,8.52 5.19,5.76 ; 5.215,-31.38 5.215,-28.62 7.79,-28.62 ; 6.14,-23.523 6.14,-24.355 ; 6.14,0.662 6.14,1.495 ; 6.79,-22.12 7.79,-22.12 ; 6.79,-0.74 7.79,-0.74 ; 7.79,5.76 5.19,5.76 ; -1.71,-26.005 -1.71,3.145 ; -1.71,-26.005 -1.06,-25.355 ; -1.71,3.145 -1.06,2.495 ; -0.81,5.76 0.7,3.145 3.69,3.145 ; 3.04,-25.355 3.04,-24.355 ; 3.04,-25.355 3.69,-26.005 3.69,-25.005 ; 3.04,-24.355 6.14,-24.355 ; 3.04,-24.355 3.69,-25.005 ; 3.04,1.495 3.04,2.495 ; 3.04,1.495 6.14,1.495 ; 3.04,1.495 3.69,2.145 ; 3.04,2.495 3.69,3.145 ; 3.69,-25.005 6.79,-25.005 ; 3.69,2.145 6.79,2.145 ; 3.69,2.145 3.69,3.145 ; 3.69,3.145 5.19,5.76 ; 6.14,-24.355 6.79,-25.005 ; 6.14,1.495 6.79,2.145 ; 6.79,-25.005 6.79,2.145 ; -2.71,-31.38 7.79,-31.38 7.79,8.52 -2.71,8.52 -2.71,-31.38
  text "c" at 4.975,2.95 h1.2
  text "10" at -5.172,-23.535 h1.2
  text "5" at -4.174,-10.885 h1.2
  text "1" at -3.839,-0.725 h1.2
  text "a" at -2,4 h1.2
Mechanical 8:
  lines w0.1: -0.5,-22.86 0,-22.86 ; -0.5,0 0,0 ; 0,-23.36 0,-22.86 ; 0,-22.36 0,-22.86 ; 0,-0.5 0,0 ; 0,0.5 0,0 ; 0.5,-22.86 0,-22.86 ; 0.5,0 0,0 ; 1.74,-28.62 2.24,-28.62 ; 1.74,5.76 2.24,5.76 ; 2.04,-22.86 2.54,-22.86 ; 2.04,0 2.54,0 ; 2.24,-29.12 2.24,-28.62 ; 2.24,-28.12 2.24,-28.62 ; 2.24,5.26 2.24,5.76 ; 2.24,6.26 2.24,5.76 ; 2.54,-23.36 2.54,-22.86 ; 2.54,-22.36 2.54,-22.86 ; 2.54,-0.5 2.54,0 ; 2.54,0.5 2.54,0 ; 2.74,-28.62 2.24,-28.62 ; 2.74,5.76 2.24,5.76 ; 3.04,-22.86 2.54,-22.86 ; 3.04,0 2.54,0 ; 4.58,-22.86 5.08,-22.86 ; 4.58,0 5.08,0 ; 5.08,-23.36 5.08,-22.86 ; 5.08,-22.36 5.08,-22.86 ; 5.08,-0.5 5.08,0 ; 5.08,0.5 5.08,0 ; 5.58,-22.86 5.08,-22.86 ; 5.58,0 5.08,0
Mechanical 14:
  drawing of 422 lines, arcs and shapes, not listed
  text "c" at 4.975,2.95 h1.2
  text "a" at -2,4 h1.2
  text "10" at -5.172,-23.535 h1.2
  text "1" at -3.839,-0.725 h1.2
  text "5" at -4.174,-10.885 h1.2
3D body: height 11.6, standoff -2.9, extent -2.71,-31.38 7.79,8.52

## HARTING_09 33 000 9811 [mm] "Single PC Board Adaptor for Han E Module"
height 23
pads (1):
  round 3 hole 1.8: 1(0,0)
Top Overlay:
  circle w0.2: c0,0 r2.6
  circle w0.2: c0,0 r2.25
Mechanical 8:
  lines w0.05: -0.5,0 0,0 ; 0,-0.5 0,0 ; 0,0.5 0,0 ; 0.5,0 0,0
Mechanical 14:
  circle w0.1: c0,0 r2.6
  circle w0.1: c0,0 r1.25
  circle w0.1: c0,0 r2.25
3D body: height 23, standoff -4.6, extent -2.6,-2.6 2.6,2.6